# Altium footprint library Modules.PcbLib: 10 footprints
Each footprint in its own frame and in the unit in brackets; x right, y up, seen from the top. Pads: shape width x height; smd on the part's side, far side on the other; paste and mask are expansions set on the pad; w line width, h text height; cw(c..) or ccw(c..) is an arc to the next point about the centre after c.
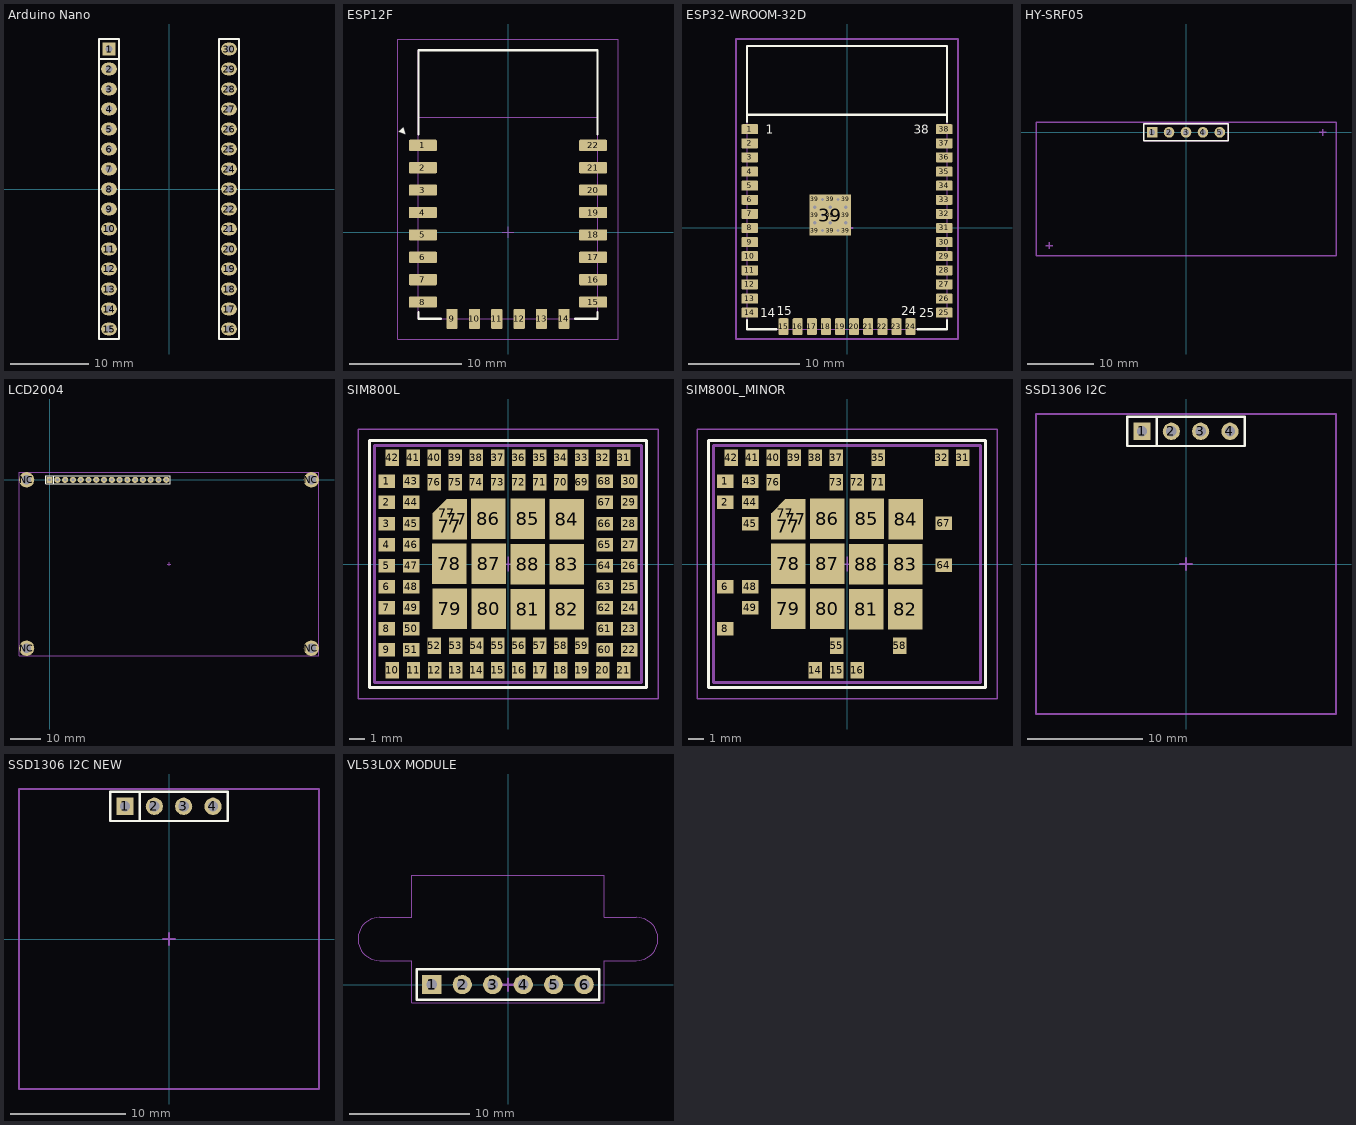
[diagram p0: the footprints below, top view; thin cyan lines are the x and y axes]

## Arduino Nano [mm]
pads (30):
  rect 1.6x1.6 hole 0.9 mask+0.05: 1(-7.62,17.78)
  oval 2x1.6 hole 0.9 mask+0.05: 2(-7.62,15.24) 3(-7.62,12.7) 4(-7.62,10.16) 5(-7.62,7.62) 6(-7.62,5.08) 7(-7.62,2.54) 8(-7.62,0) 9(-7.62,-2.54) 10(-7.62,-5.08) 11(-7.62,-7.62) 12(-7.62,-10.16) 13(-7.62,-12.7) 14(-7.62,-15.24) 15(-7.62,-17.78) 16(7.62,-17.78) 17(7.62,-15.24) 18(7.62,-12.7) 19(7.62,-10.16) 20(7.62,-7.62) 21(7.62,-5.08) 22(7.62,-2.54) 23(7.62,0) 24(7.62,2.54) 25(7.62,5.08) 26(7.62,7.62) 27(7.62,10.16) 28(7.62,12.7) 29(7.62,15.24) 30(7.62,17.78)
Top Overlay:
  lines w0.2: -8.89,16.51 -6.35,16.51 ; -8.89,-19.05 -8.89,19.05 -6.35,19.05 -6.35,-19.05 -8.89,-19.05 ; 6.35,-19.05 6.35,19.05 8.89,19.05 8.89,-19.05 6.35,-19.05

## ESP12F [mm]
pads (22):
  rrect20% 2.5x1 smd paste+0 mask+0.05: 1(-7.6,7.75) 2(-7.6,5.75) 3(-7.6,3.75) 4(-7.6,1.75) 5(-7.6,-0.25) 6(-7.6,-2.25) 7(-7.6,-4.25) 8(-7.6,-6.25) 15(7.6,-6.25) 16(7.6,-4.25) 17(7.6,-2.25) 18(7.6,-0.25) 19(7.6,1.75) 20(7.6,3.75) 21(7.6,5.75) 22(7.6,7.75)
  rrect20% 1x1.8 smd paste+0 mask+0.05: 9(-5,-7.75) 10(-3,-7.75) 11(-1,-7.75) 12(1,-7.75) 13(3,-7.75) 14(5,-7.75)
Top Overlay:
  lines w0.2: -8,-7.15 -8,-7.75 -6,-7.75 ; -8,8.75 -8,16.25 8,16.25 8,8.75 ; 6,-7.75 8,-7.75 8,-7.15
  text "▲" at -9.413,9.448 h1
Top Assembly:
  lines w0.1: -8,10.25 8,10.25 ; -8,-7.75 8,-7.75 8,16.25 -8,16.25 -8,-7.75
Top Courtyard:
  lines w0.1: -9.85,-9.55 9.85,-9.55 9.85,17.25 -9.85,17.25 -9.85,-9.55
Top Component Center:
  lines w0.1: -0.5,0 0.5,0 ; 0,-0.5 0,0.5
3D body "ESP-12F.step": height 2.85, standoff -0.01, extent -8.02,-7.75 8,16.26

## ESP32-WROOM-32D [mm] "ESP32-WROOM-32D and ESP32-WROOM-32U are powerful, generic Wi-Fi + Bluetooth® + Bluetooth LE MCU  modules that target a wide variety of applications, ranging from low-power sensor networks to the most  demanding tasks, such as voice encoding, music streaming and MP3 decoding."
pads (48):
  rrect20% 1.5x0.9 smd mask+0.05: 1(-8.75,8.88) 2(-8.75,7.61) 3(-8.75,6.34) 4(-8.75,5.07) 5(-8.75,3.8) 6(-8.75,2.53) 7(-8.75,1.26) 8(-8.75,-0.01) 9(-8.75,-1.28) 10(-8.75,-2.55) 11(-8.75,-3.82) 12(-8.75,-5.09) 13(-8.75,-6.36) 14(-8.75,-7.63) 25(8.75,-7.63) 26(8.75,-6.36) 27(8.75,-5.09) 28(8.75,-3.82) 29(8.75,-2.55) 30(8.75,-1.28) 31(8.75,-0.01) 32(8.75,1.26) 33(8.75,2.53) 34(8.75,3.8) 35(8.75,5.07) 36(8.75,6.34) 37(8.75,7.61) 38(8.75,8.88)
  rrect20% 0.9x1.5 smd mask+0.05: 15(-5.71,-8.88) 16(-4.44,-8.88) 17(-3.17,-8.88) 18(-1.9,-8.88) 19(-0.63,-8.88) 20(0.64,-8.88) 21(1.91,-8.88) 22(3.18,-8.88) 23(4.45,-8.88) 24(5.72,-8.88)
  rrect0% 0.9x0.9 on Top Paste mask+0.05: 39(-2.905,-0.24) 39(-2.905,1.16) 39(-2.905,2.56) 39(-1.505,-0.24) 39(-1.505,1.16) 39(-1.505,2.56) 39(-0.105,-0.24) 39(-0.105,1.16) 39(-0.105,2.56)
  rrect0% 3.7x3.7 smd paste-2539.97 mask+0.05: 39(-1.505,1.16)
via -2.205,-0.24 diameter 0.6 hole 0.3
via -0.805,-0.24 diameter 0.6 hole 0.3
via -0.105,0.46 diameter 0.6 hole 0.3
via -1.505,0.46 diameter 0.6 hole 0.3
via -2.905,0.46 diameter 0.6 hole 0.3
via -0.805,1.16 diameter 0.6 hole 0.3
via -2.205,1.16 diameter 0.6 hole 0.3
via -0.105,1.86 diameter 0.6 hole 0.3
via -1.505,1.86 diameter 0.6 hole 0.3
via -2.905,1.86 diameter 0.6 hole 0.3
via -0.805,2.56 diameter 0.6 hole 0.3
via -2.205,2.56 diameter 0.6 hole 0.3
Top Overlay:
  lines w0.2: -9,-8.28 -9,-9.13 -6.36,-9.13 ; -9,9.53 -9,16.37 9,16.37 9,9.53 ; -9,10.18 9,10.18 ; 6.37,-9.13 9,-9.13 9,-8.28
  text "38" at 5.99,8.458 h0.8
  text "1" at -7.31,8.458 h0.8
  text "15" at -6.31,-7.842 h0.8
  text "14" at -7.81,-8.042 h0.8
  text "25" at 6.49,-8.042 h0.8
  text "24" at 4.89,-7.842 h0.8
Top Assembly:
  lines w0.1: -9,10.18 9,10.18 ; -9,-9.13 -9,16.37 9,16.37 9,-9.13 -9,-9.13
Top Courtyard:
  lines w0.2: -10,-10 10,-10 10,17 -10,17 -10,-10
Top Component Center:
  lines w0.2: -0.5,0 0.5,0 ; 0,-0.5 0,0.5
3D body "ESP32-WROOM-32D.step": height 2.6, standoff -0.01, extent -8.96,-9.097 8.94,16.358

## HY-SRF05 [mm]
height 0.89
pads (5):
  rect 1.6x1.6 hole 0.9 mask+0.05: 1(-5.08,0)
  round 1.6 hole 0.9 mask+0.05: 2(-2.54,0) 3(0,0) 4(2.54,0) 5(5.08,0)
Top Overlay:
  lines w0.2: -6.35,-1.27 6.35,-1.27 6.35,1.27 -6.35,1.27 -6.35,-1.27
Top Assembly:
  lines w0.1: -6.35,-1.27 6.35,-1.27 6.35,1.27 -6.35,1.27 -6.35,-1.27
  lines w0.2: -21,-17 -20,-17 ; -20.5,-17.5 -20.5,-16.5 ; 20,0 21,0 ; 20.5,-0.5 20.5,0.5 ; -22.5,-18.5 22.5,-18.5 22.5,1.5 -22.5,1.5 -22.5,-18.5
Top Courtyard:
  lines w0.05: -6.35,-1.27 6.35,-1.27 6.35,1.27 -6.35,1.27 -6.35,-1.27
Top Component Center:
  lines w0.2: -0.5,0 0.5,0 ; 0,-0.5 0,0.5

## LCD2004 [mm]
pads (20):
  rect 2x2 hole 0.9 mask+0.05: 1(0,0)
  round 2 hole 0.9 mask+0.05: 2(2.54,0) 3(5.08,0) 4(7.62,0) 5(10.16,0) 6(12.7,0) 7(15.24,0) 8(17.78,0) 9(20.32,0) 10(22.86,0) 11(25.4,0) 12(27.94,0) 13(30.48,0) 14(33.02,0) 15(35.56,0) 16(38.1,0)
  round 5 hole 3 mask+0.05: NC(-7.5,-55) NC(-7.5,0) NC(85.5,-55) NC(85.5,0)
Top Overlay:
  lines w0.2: 1.27,-1.27 1.27,1.27 ; -1.27,-1.27 39.37,-1.27 39.37,1.27 -1.27,1.27 -1.27,-1.27
Top Assembly:
  lines w0.2: -10,-57.5 -10,2.5 88,2.5 88,-57.5 -10,-57.5
Top Courtyard:
  lines w0.2: -10,-57.5 -10,2.5 88,2.5 88,-57.5 -10,-57.5
Top Component Center:
  lines w0.1: 38.5,-27.5 39.5,-27.5 ; 39,-28 39,-27
3D body "LCD 2004.stp": height 22.47, standoff 8.47, extent -10.008,-57.519 87.992,2.481

## SIM800L [mm]
height 1.3
pads (90):
  rect 1.1x0.9 smd mask+0.05: 1(-8.1,5.5) 2(-8.1,4.1) 3(-8.1,2.7) 4(-8.1,1.3) 5(-8.1,-0.1) 6(-8.1,-1.5) 7(-8.1,-2.9) 8(-8.1,-4.3) 9(-8.1,-5.7) 22(8.1,-5.7) 23(8.1,-4.3) 24(8.1,-2.9) 25(8.1,-1.5) 26(8.1,-0.1) 27(8.1,1.3) 28(8.1,2.7) 29(8.1,4.1) 30(8.1,5.5) 43(-6.45,5.5) 44(-6.45,4.1) 45(-6.45,2.7) 46(-6.45,1.3) 47(-6.45,-0.1) 48(-6.45,-1.5) 49(-6.45,-2.9) 50(-6.45,-4.3) 51(-6.45,-5.7) 60(6.45,-5.7) 61(6.45,-4.3) 62(6.45,-2.9) 63(6.45,-1.5) 64(6.45,-0.1) 65(6.45,1.3) 66(6.45,2.7) 67(6.45,4.1) 68(6.45,5.5)
  rect 0.9x1.1 smd mask+0.05: 10(-7.7,-7.1) 11(-6.3,-7.1) 12(-4.9,-7.1) 13(-3.5,-7.1) 14(-2.1,-7.1) 15(-0.7,-7.1) 16(0.7,-7.1) 17(2.1,-7.1) 18(3.5,-7.1) 19(4.9,-7.1) 20(6.3,-7.1) 21(7.7,-7.1) 31(7.7,7.1) 32(6.3,7.1) 33(4.9,7.1) 34(3.5,7.1) 35(2.1,7.1) 36(0.7,7.1) 37(-0.7,7.1) 38(-2.1,7.1) 39(-3.5,7.1) 40(-4.9,7.1) 41(-6.3,7.1) 42(-7.7,7.1) 52(-4.9,-5.45) 53(-3.5,-5.45) 54(-2.1,-5.45) 55(-0.7,-5.45) 56(0.7,-5.45) 57(2.1,-5.45) 58(3.5,-5.45) 59(4.9,-5.45) 69(4.9,5.45) 70(3.5,5.45) 71(2.1,5.45) 72(0.7,5.45) 73(-0.7,5.45) 74(-2.1,5.45) 75(-3.5,5.45) 76(-4.9,5.45)
  rect 1.344x1.344 smd rot 45 mask+0.05: 77(-4.1,3.4)
  rect 2.3x1.75 smd mask+0.05: 77(-3.9,2.525)
  rect 1.35x2.7 smd mask+0.05: 77(-3.425,3)
  rect 2.3x2.7 smd mask+0.05: 78(-3.9,0) 79(-3.9,-3) 80(-1.3,-3) 81(1.3,-3) 82(3.9,-3) 83(3.9,0) 84(3.9,3) 85(1.3,3) 86(-1.3,3) 87(-1.3,0) 88(1.3,0)
Top Overlay:
  lines w0.2: -9.25,-8.25 -9.25,8.25 9.25,8.25 9.25,-8.25 -9.25,-8.25
Top Assembly:
  lines w0.2: -8.9,-7.9 8.9,-7.9 8.9,7.9 -8.9,7.9 -8.9,-7.9
Top Courtyard:
  lines w0.1: -10,-9 10,-9 10,9 -10,9 -10,-9
Top Component Center:
  lines w0.1: -0.5,0 0.5,0 ; 0,-0.5 0,0.5
3D body "User Library-SIM800L-1.STEP": height 2.5, standoff 0, extent -8.925,-7.9 8.925,7.9

## SIM800L_MINOR [mm]
height 1.3
pads (43):
  rect 1.1x0.9 smd mask+0.05: 1(-8.1,5.5) 2(-8.1,4.1) 6(-8.1,-1.5) 8(-8.1,-4.3) 43(-6.45,5.5) 44(-6.45,4.1) 45(-6.45,2.7) 48(-6.45,-1.5) 49(-6.45,-2.9) 64(6.45,-0.1) 67(6.45,2.7)
  rect 0.9x1.1 smd mask+0.05: 14(-2.1,-7.1) 15(-0.7,-7.1) 16(0.7,-7.1) 31(7.7,7.1) 32(6.3,7.1) 35(2.1,7.1) 37(-0.7,7.1) 38(-2.1,7.1) 39(-3.5,7.1) 40(-4.9,7.1) 41(-6.3,7.1) 42(-7.7,7.1) 55(-0.7,-5.45) 58(3.5,-5.45) 71(2.1,5.45) 72(0.7,5.45) 73(-0.7,5.45) 76(-4.9,5.45)
  rect 1.344x1.344 smd rot 45 mask+0.05: 77(-4.1,3.4)
  rect 2.3x1.75 smd mask+0.05: 77(-3.9,2.525)
  rect 1.35x2.7 smd mask+0.05: 77(-3.425,3)
  rect 2.3x2.7 smd mask+0.05: 78(-3.9,0) 79(-3.9,-3) 80(-1.3,-3) 81(1.3,-3) 82(3.9,-3) 83(3.9,0) 84(3.9,3) 85(1.3,3) 86(-1.3,3) 87(-1.3,0) 88(1.3,0)
Top Overlay:
  lines w0.2: -9.25,-8.25 9.25,-8.25 9.25,8.25 -9.25,8.25 -9.25,-8.25
Top Assembly:
  lines w0.2: -8.9,-7.9 8.9,-7.9 8.9,7.9 -8.9,7.9 -8.9,-7.9
Top Courtyard:
  lines w0.1: -10,-9 10,-9 10,9 -10,9 -10,-9
Top Component Center:
  lines w0.1: -0.5,0 0.5,0 ; 0,-0.5 0,0.5
3D body "User Library-SIM800L-1.STEP": height 2.5, standoff 0, extent -8.925,-7.9 8.925,7.9

## SSD1306 I2C [mm]
pads (4):
  rect 1.5x1.5 hole 0.9 mask+0.05: 1(-3.81,11.5)
  round 1.5 hole 0.9 mask+0.05: 2(-1.27,11.5) 3(1.27,11.5) 4(3.81,11.5)
Top Overlay:
  lines w0.2: -2.54,10.23 -2.54,12.77 ; -5.08,10.23 5.08,10.23 5.08,12.77 -5.08,12.77 -5.08,10.23
Top Assembly:
  lines w0.2: -13,-13 13,-13 13,13 -13,13 -13,-13
Top Component Center:
  lines w0.2: -0.5,0 0.5,0 ; 0,-0.5 0,0.5
3D body "Pantalla OLED 0.96'' 128x64.stp": height 5.6, standoff -5.4, extent -14.2,-14.4 14.2,13

## SSD1306 I2C NEW [mm]
pads (4):
  rect 1.5x1.5 hole 0.9 mask+0.05: 1(-3.81,11.5)
  round 1.5 hole 0.9 mask+0.05: 2(-1.27,11.5) 3(1.27,11.5) 4(3.81,11.5)
Top Overlay:
  lines w0.2: -2.54,10.23 -2.54,12.77 ; -5.08,10.23 -5.08,12.77 5.08,12.77 5.08,10.23 -5.08,10.23
Top Assembly:
  lines w0.2: -13,-13 -13,13 13,13 13,-13 -13,-13
Top Component Center:
  lines w0.2: -0.5,0 0.5,0 ; 0,-0.5 0,0.5
3D body "OLED Display 0.96_.step": height 6.06, standoff -6.24, extent -13,-14.108 13,13.108

## VL53L0X MODULE [mm] "Connector; Header; 6 Position"
height 0.89
pads (6):
  rect 1.6x1.6 hole 0.9 mask+0.05: 1(-6.35,0)
  round 1.6 hole 0.9 mask+0.05: 2(-3.81,0) 3(-1.27,0) 4(1.27,0) 5(3.81,0) 6(6.35,0)
Top Overlay:
  lines w0.2: -7.62,-1.27 7.62,-1.27 7.62,1.27 -7.62,1.27 -7.62,-1.27
Top Assembly:
  lines w0.1: -10.7,2 cw(c-10.7,3.8) -10.7,5.6 -8,5.6 -8,9.1 8,9.1 8,5.6 10.7,5.6 cw(c10.7,3.8) 10.7,2 8,2 8,-1.5 -8,-1.5 -8,2 -10.7,2
Top Component Center:
  lines w0.2: -0.5,0 0.5,0 ; 0,-0.5 0,0.5
3D body "GY-VL53L1XV2.STEP": height 6.2, standoff -5.7, extent -12.5,-1.5 12.5,9.1